# Altium footprint library PCB_ConnectorHDR.PcbLib: 221 footprints (part 9 of 14)
Each footprint in its own frame and in the unit in brackets; x right, y up, seen from the top. Pads: shape width x height; smd on the part's side, far side on the other; paste and mask are expansions set on the pad; w line width, h text height; cw(c..) or ccw(c..) is an arc to the next point about the centre after c.
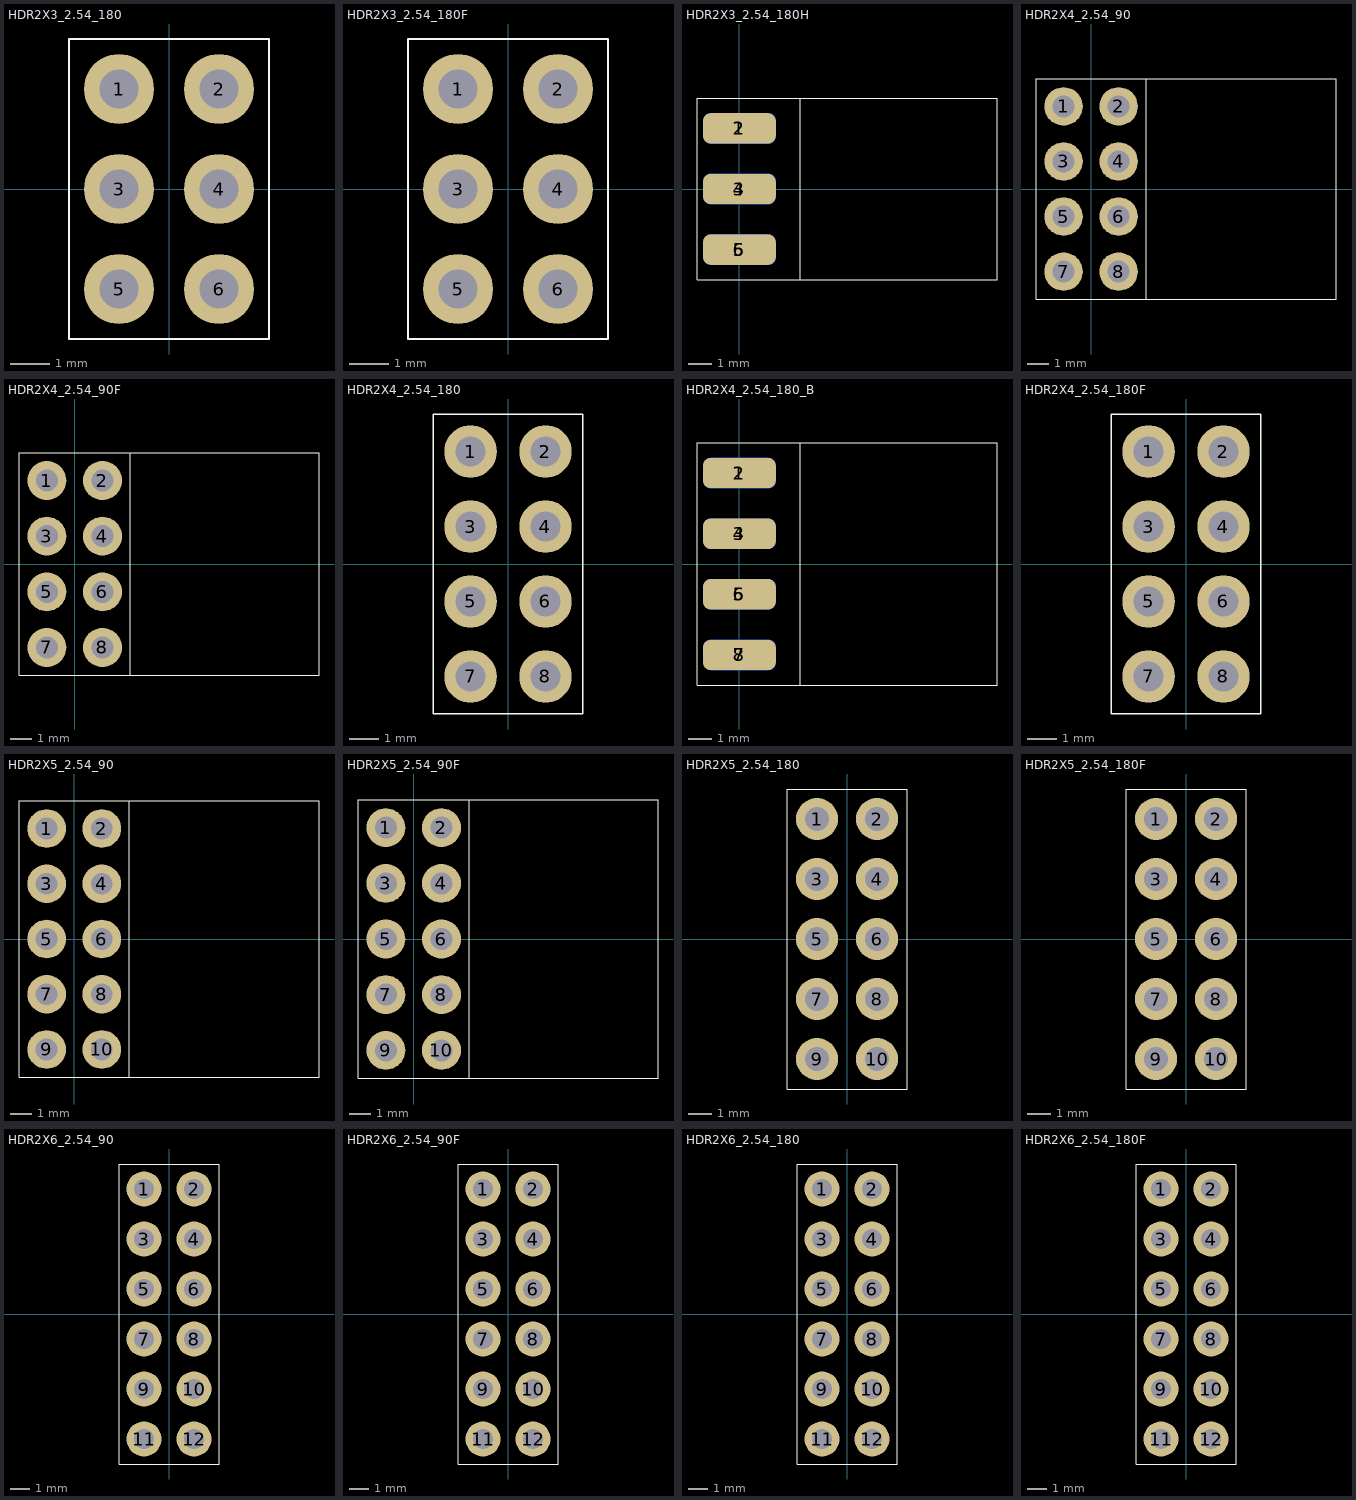
[diagram p8: the footprints below, top view; thin cyan lines are the x and y axes]

## HDR2X3_2.54_180 [mil]
height 169.29
pads (6):
  round 70 hole 39.37: 1(-50,100) 2(50,100) 3(-50,0) 4(50,0) 5(-50,-100) 6(50,-100)
Top Overlay:
  lines w2: -100,-150 100,-150 ; -100,-150 -100,150 ; -100,-150 100,-150 ; -100,-150 -100,150 ; -100,150 100,150 ; -100,150 100,150 ; 100,-150 100,150 ; 100,-150 100,150
3D body "pin_header_awl254-dg-g06d.stp": height 334.65, standoff -118.11, extent -100,-149.99 100,150

## HDR2X3_2.54_180F [mil]
height 169.29
pads (6):
  round 70 hole 39.37: 1(-50,100) 2(50,100) 3(-50,0) 4(50,0) 5(-50,-100) 6(50,-100)
Top Overlay:
  lines w2: -100,-150 -100,150 ; -100,-150 100,-150 ; -100,-150 -100,150 ; -100,-150 100,-150 ; -100,150 100,150 ; -100,150 100,150 ; 100,-150 100,150 ; 100,-150 100,150
3D body "female_header_a-bl254-dg-g06d.stp": height 334.65, standoff -125.98, extent -98.42,-154.91 98.43,154.92

## HDR2X3_2.54_180H [mil]
height 169.29
pads (6):
  rrect50% 120x50 smd: 1(0,100) 3(0,0) 5(0,-100)
  rrect50% 120x50 smd far side: 2(0,100) 4(0,0) 6(0,-100)
Top Overlay:
  lines w2: -70,-150 -70,150 ; -70,-150 100,-150 ; -70,-150 -70,150 ; -70,-150 425,-150 425,150 -70,150 ; -70,-150 -70,150 ; -70,-150 100,-150 ; -70,150 100,150 ; -70,150 100,150 ; 100,-150 100,150 ; 100,-150 100,150
3D body "pin_header_awl254-dg-g06d.stp": height 100, standoff -100, extent -38.11,-150 414.65,150

## HDR2X4_2.54_90 [mil]
height 169.29
pads (8):
  round 70 hole 39.37: 1(-50,150) 2(50,150) 3(-50,50) 4(50,50) 5(-50,-50) 6(50,-50) 7(-50,-150) 8(50,-150)
Top Overlay:
  lines w2: -100,-200 -100,200 ; -100,-200 445,-200 445,200 -100,200 ; -100,-200 -100,200 ; -100,-200 100,-200 100,200 -100,200
3D body "pin_header_awl254-da-g08d.stp": height 198.43, standoff -116.54, extent -62.44,-199.99 444.65,200.01

## HDR2X4_2.54_90F [mil]
height 169.29
pads (8):
  round 70 hole 39.37: 1(-50,150) 2(50,150) 3(-50,50) 4(50,50) 5(-50,-50) 6(50,-50) 7(-50,-150) 8(50,-150)
Top Overlay:
  lines w2: -100,-200 -100,200 ; -100,-200 100,-200 100,200 -100,200 ; -100,-200 -100,200 ; -100,-200 439,-200 439,200 -100,200
3D body "female_header_A-BL254-DA-G08D.stp": height 197.35, standoff -125.48, extent -57.41,-203.92 438.65,205.92

## HDR2X4_2.54_180 [mil]
height 169.29
pads (8):
  round 70 hole 39.37: 1(-50,150) 2(50,150) 3(-50,50) 4(50,50) 5(-50,-50) 6(50,-50) 7(-50,-150) 8(50,-150)
Top Overlay:
  lines w2: -100,-200 100,-200 ; -100,-200 -100,200 ; -100,-200 100,-200 ; -100,-200 -100,200 ; -100,200 100,200 ; -100,200 100,200 ; 100,-200 100,200 ; 100,-200 100,200
3D body "pin_header_awl254-dg-g08d.stp": height 335.15, standoff -117.61, extent -99,-200 101,200

## HDR2X4_2.54_180_B [mil]
height 169.29
pads (8):
  rrect50% 120x50 smd: 1(0,150) 3(0,50) 5(0,-50) 7(0,-150)
  rrect50% 120x50 smd far side: 2(0,150) 4(0,50) 6(0,-50) 8(0,-150)
Top Overlay:
  lines w2: -70,-200 100,-200 ; -70,-200 -70,200 ; -70,-200 425,-200 425,200 -70,200 ; -70,-200 -70,200 ; -70,-200 100,-200 ; -70,-200 -70,200 ; -70,200 100,200 ; -70,200 100,200 ; 100,-200 100,200 ; 100,-200 100,200
3D body "pin_header_awl254-dg-g08d.stp": height 100, standoff -100, extent -38.11,-199.99 414.64,200.01

## HDR2X4_2.54_180F [mil]
height 169.29
pads (8):
  round 70 hole 39.37: 1(-50,150) 2(50,150) 3(-50,50) 4(50,50) 5(-50,-50) 6(50,-50) 7(-50,-150) 8(50,-150)
Top Overlay:
  lines w2: -100,-200 -100,200 ; -100,-200 100,-200 ; -100,-200 -100,200 ; -100,-200 100,-200 ; -100,200 100,200 ; -100,200 100,200 ; 100,-200 100,200 ; 100,-200 100,200
3D body "female_header_a-bl254-dg-g08d.stp": height 334.65, standoff -125.98, extent -98.43,-204.84 98.43,205

## HDR2X5_2.54_90 [mil]
height 169.29
pads (10):
  round 70 hole 39.37: 1(-50,200) 2(50,200) 3(-50,100) 4(50,100) 5(-50,0) 6(50,0) 7(-50,-100) 8(50,-100) 9(-50,-200) 10(50,-200)
Top Overlay:
  lines w2: -100,-250 -100,250 ; -100,-250 443,-250 443,250 -100,250 ; -100,-250 -100,250 ; -100,-250 100,-250 100,250 -100,250
3D body "pin_header_awl254-da-g10d.stp": height 197.35, standoff -117.61, extent -64,-250 443.09,250

## HDR2X5_2.54_90F [mil]
height 169.29
pads (10):
  round 70 hole 39.37: 1(-50,200) 2(50,200) 3(-50,100) 4(50,100) 5(-50,0) 6(50,0) 7(-50,-100) 8(50,-100) 9(-50,-200) 10(50,-200)
Top Overlay:
  lines w2: -100,-250 -100,250 ; -100,-250 439,-250 439,250 -100,250 ; -100,-250 -100,250 ; -100,-250 100,-250 100,250 -100,250
3D body "female_header_a-bl254-da-g10d.stp": height 197.35, standoff -125.48, extent -57,-254.84 439.06,255

## HDR2X5_2.54_180 [mil]
height 169.29
pads (10):
  round 70 hole 39.37: 1(-50,200) 2(50,200) 3(-50,100) 4(50,100) 5(-50,0) 6(50,0) 7(-50,-100) 8(50,-100) 9(-50,-200) 10(50,-200)
Top Overlay:
  lines w2: -100,-250 100,-250 ; -100,-250 -100,250 ; -100,-250 -100,250 ; -100,-250 100,-250 ; -100,250 100,250 ; -100,250 100,250 ; 100,-250 100,250 ; 100,-250 100,250
3D body "pin_header_awl254-dg-g10d.stp": height 334.65, standoff -118.11, extent -100,-250 100,250

## HDR2X5_2.54_180F [mil]
height 169.29
pads (10):
  round 70 hole 39.37: 1(-50,200) 2(50,200) 3(-50,100) 4(50,100) 5(-50,0) 6(50,0) 7(-50,-100) 8(50,-100) 9(-50,-200) 10(50,-200)
Top Overlay:
  lines w2: -100,-250 -100,250 ; -100,-250 100,-250 ; -100,-250 -100,250 ; -100,-250 100,-250 ; -100,250 100,250 ; -100,250 100,250 ; 100,-250 100,250 ; 100,-250 100,250
3D body "female_header_a-bl254-dg-g10d.stp": height 334.65, standoff -125.98, extent -98.43,-254.92 98.42,254.92

## HDR2X6_2.54_90 [mil]
height 169.29
pads (12):
  round 70 hole 39.37: 1(-50,250) 2(50,250) 3(-50,150) 4(50,150) 5(-50,50) 6(50,50) 7(-50,-50) 8(50,-50) 9(-50,-150) 10(50,-150) 11(-50,-250) 12(50,-250)
Top Overlay:
  lines w2: -100,-300 100,-300 ; -100,-300 -100,300 ; -100,-300 100,-300 ; -100,-300 -100,300 ; -100,300 100,300 ; -100,300 100,300 ; 100,-300 100,300 ; 100,-300 100,300
3D body "pin_header_awl254-da-g12d.stp": height 197.35, standoff -117.61, extent -63,-301 444.09,299

## HDR2X6_2.54_90F [mil]
height 169.29
pads (12):
  round 70 hole 39.37: 1(-50,250) 2(50,250) 3(-50,150) 4(50,150) 5(-50,50) 6(50,50) 7(-50,-50) 8(50,-50) 9(-50,-150) 10(50,-150) 11(-50,-250) 12(50,-250)
Top Overlay:
  lines w2: -100,-300 100,-300 ; -100,-300 -100,300 ; -100,-300 100,-300 ; -100,-300 -100,300 ; -100,300 100,300 ; -100,300 100,300 ; 100,-300 100,300 ; 100,-300 100,300
3D body "female_header_A-BL254-DA-G12D.stp": height 197.35, standoff -125.48, extent -60,-304.84 436.06,305

## HDR2X6_2.54_180 [mil]
height 169.29
pads (12):
  round 70 hole 39.37: 1(-50,250) 2(50,250) 3(-50,150) 4(50,150) 5(-50,50) 6(50,50) 7(-50,-50) 8(50,-50) 9(-50,-150) 10(50,-150) 11(-50,-250) 12(50,-250)
Top Overlay:
  lines w2: -100,-300 -100,300 ; -100,-300 100,-300 ; -100,-300 -100,300 ; -100,-300 100,-300 ; -100,300 100,300 ; -100,300 100,300 ; 100,-300 100,300 ; 100,-300 100,300
3D body "User Library-PLD-12.step": height 330.71, standoff -118.11, extent -98.43,-300 98.43,300

## HDR2X6_2.54_180F [mil]
height 169.29
pads (12):
  round 70 hole 39.37: 1(-50,250) 2(50,250) 3(-50,150) 4(50,150) 5(-50,50) 6(50,50) 7(-50,-50) 8(50,-50) 9(-50,-150) 10(50,-150) 11(-50,-250) 12(50,-250)
Top Overlay:
  lines w2: -100,-300 100,-300 ; -100,-300 -100,300 ; -100,-300 100,-300 ; -100,-300 -100,300 ; -100,300 100,300 ; -100,300 100,300 ; 100,-300 100,300 ; 100,-300 100,300
3D body "female_header_a-bl254-dg-g12d.stp": height 334.65, standoff -125.98, extent -98,-304.84 98.85,305